# Altium footprint library RELAY.PcbLib: 18 footprints (part 2 of 2)
Each footprint in its own frame and in the unit in brackets; x right, y up, seen from the top. Pads: shape width x height; smd on the part's side, far side on the other; paste and mask are expansions set on the pad; w line width, h text height; cw(c..) or ccw(c..) is an arc to the next point about the centre after c.
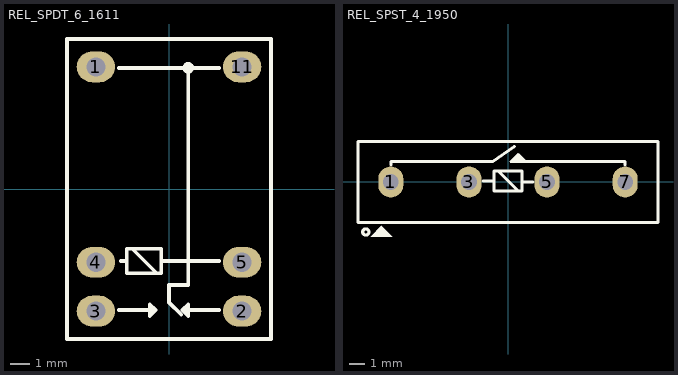
[diagram p1: the footprints below, top view; thin cyan lines are the x and y axes]

## REL_SPDT_6_1611 [mm] "RELAY, SPDT, 15.7X11X12mm, HFD41, HK4100F, TRB"
height 12
pads (6):
  oval 2x1.6 hole 1: 1(-3.8,6.35) 2(3.8,-6.35) 3(-3.8,-6.35) 4(-3.8,-3.81) 5(3.8,-3.81) 11(3.8,6.35)
Top Overlay:
  circle w0.2: c1,6.3 r0.2
  lines w0.2: -2.6,-6.3 -0.7,-6.3 ; -2.6,6.3 2.6,6.3 ; -2.5,-3.744 -2.297,-3.744 ; -1.908,-3.109 -0.638,-4.379 ; -0.4,-3.744 2.6,-3.744 ; 0.635,-6.535 0,-5.9 0,-5 1,-5 1,6.3 ; 2.6,-6.3 0.7,-6.3 ; -0.7,-6.3 -1,-6 -1,-6.6 -0.7,-6.3 ; 0.7,-6.3 1,-6.6 1,-6 0.7,-6.3 ; -5.3,-7.8 -5.3,7.8 5.3,7.8 5.3,-7.8 -5.3,-7.8 ; -2.2,-4.379 -0.4,-4.379 -0.4,-3.109 -2.2,-3.109 -2.2,-4.379
3D body "User Library-HK4100F.step": height 11.81, standoff -2.75, extent -5.2,-7.7 5.2,7.7

## REL_SPST_4_1950 [mm] "RELAY, SPST, 19X5X7.4mm, S1A05,"
height 7.4
pads (4):
  oval 1.6x2 hole 1: 1(-7.5,0) 3(-2.5,0) 5(2.5,0) 7(7.5,0)
Top Overlay:
  circle w0.2: c-9.1,-3.2 r0.2
  region: -8.8,-3.5 -7.4,-3.5 -8.1,-2.8
  region: 0.2,1.3 1.1,1.3 0.65,1.75
  lines w0.2: -7.5,1.1 -7.5,1.3 -1,1.3 0.396,2.26 ; -1.6,0.056 -0.997,0.056 ; -0.608,0.691 0.662,-0.579 ; 0.9,0 1.6,0 ; 7.5,1.1 7.5,1.3 7.5,1.3 1.1,1.3 ; 1.1,1.3 0.65,1.75 0.2,1.3 0.2,1.3 1.1,1.3 ; -9.6,-2.6 9.6,-2.6 9.6,2.6 -9.6,2.6 -9.6,-2.6 ; -0.9,-0.579 0.9,-0.579 0.9,0.691 -0.9,0.691 -0.9,-0.579
3D body: height 0, standoff -3.6, extent 7.25,-0.25 7.75,0.25
3D body: height 0, standoff -3.6, extent 2.25,-0.25 2.75,0.25
3D body: height 0, standoff -3.6, extent -2.75,-0.25 -2.25,0.25
3D body: height 0, standoff -3.6, extent -7.75,-0.25 -7.25,0.25
3D body: height 7.4, standoff 0, extent -9.5,-2.5 9.5,2.5